# Altium footprint library Wurth_Elektronik_Electromechanic_Wire_to_Board_Connectors_rev16a.PCBLIB: 662 footprints (part 25 of 42)
Each footprint in its own frame and in the unit in brackets; x right, y up, seen from the top. Pads: shape width x height; smd on the part's side, far side on the other; paste and mask are expansions set on the pad; w line width, h text height; cw(c..) or ccw(c..) is an arc to the next point about the centre after c.
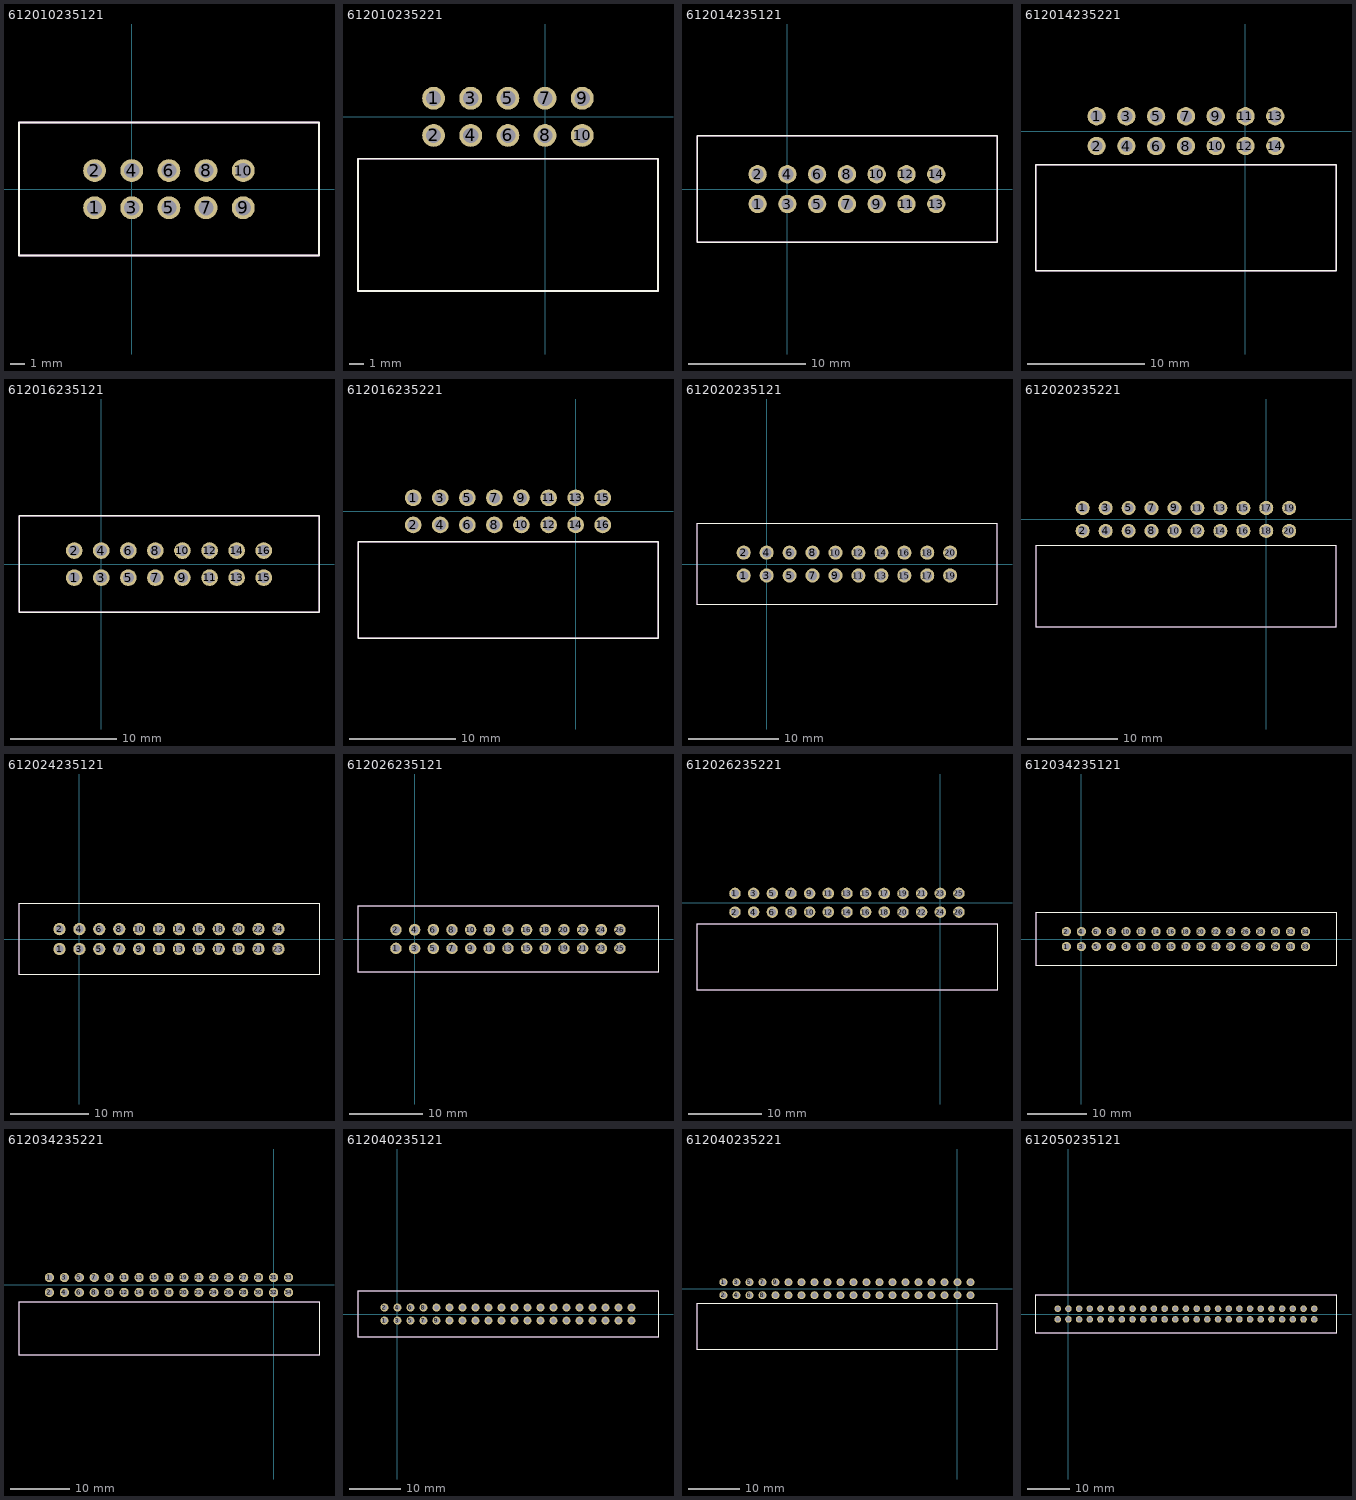
[diagram p24: the footprints below, top view; thin cyan lines are the x and y axes]

## 612010235121 [mil]
pads (10):
  round 61.5 hole 41: 1(-100,-50) 2(-100,50) 3(0,-50) 4(0,50) 5(100,-50) 6(100,50) 7(200,-50) 8(200,50) 9(300,-50) 10(300,50)
Top Overlay:
  lines w5: -303.54,-178.15 504,-178.15 504,179 -303.54,179 -303.54,-178.15
Mechanical 2:
  text ">NAME" at 25,200 h77.5
Mechanical 4:
  text ">VALUE" at 0,-250 h77.5
Mechanical 16:
  lines w5: -303.54,-178.15 504,-178.15 504,179 -303.54,179 -303.54,-178.15
  text "1" at -125,-75 h77.5
  text "10" at 275,25 h77.5

## 612010235221 [mil]
pads (10):
  round 61.5 hole 41: 1(-300,50) 2(-300,-50) 3(-200,50) 4(-200,-50) 5(-100,50) 6(-100,-50) 7(0,50) 8(0,-50) 9(100,50) 10(100,-50)
Top Overlay:
  lines w5: -503.54,-469.29 304,-469.29 304,-112.99 -503.54,-112.99 -503.54,-469.29
Mechanical 2:
  text ">NAME" at 360,-254.74 h77.5
Mechanical 4:
  text ">VALUE" at 360,-347.69 h77.5
Mechanical 16:
  lines w5: -503.54,-469.29 304,-469.29 304,-112.99 -503.54,-112.99 -503.54,-469.29
  text "1" at -325,25 h77.5
  text "10" at 50,-75 h77.5

## 612014235121 [mil]
pads (14):
  round 61.5 hole 41: 1(-100,-50) 2(-100,50) 3(0,-50) 4(0,50) 5(100,-50) 6(100,50) 7(200,-50) 8(200,50) 9(300,-50) 10(300,50) 11(400,-50) 12(400,50) 13(500,-50) 14(500,50)
Top Overlay:
  lines w5: -303.54,-178.15 704,-178.15 704,179 -303.54,179 -303.54,-178.15
Mechanical 2:
  text ">NAME" at 125,200 h77.5
Mechanical 4:
  text ">VALUE" at 100,-250 h77.5
Mechanical 16:
  lines w5: -303.54,-178.15 704,-178.15 704,179 -303.54,179 -303.54,-178.15
  text "1" at -125,-75 h77.5
  text "14" at 450,25 h77.5

## 612014235221 [mil]
pads (14):
  round 61.5 hole 41: 1(-500,50) 2(-500,-50) 3(-400,50) 4(-400,-50) 5(-300,50) 6(-300,-50) 7(-200,50) 8(-200,-50) 9(-100,50) 10(-100,-50) 11(0,50) 12(0,-50) 13(100,50) 14(100,-50)
Top Overlay:
  lines w5: -703.54,-469.29 304,-469.29 304,-112.99 -703.54,-112.99 -703.54,-469.29
Mechanical 2:
  text ">NAME" at 360,-254.74 h77.5
Mechanical 4:
  text ">VALUE" at 360,-347.69 h77.5
Mechanical 16:
  lines w5: -703.54,-469.29 304,-469.29 304,-112.99 -703.54,-112.99 -703.54,-469.29
  text "1" at -525,25 h77.5
  text "14" at 50,-75 h77.5

## 612016235121 [mil]
pads (16):
  round 61.5 hole 41: 1(-100,-50) 2(-100,50) 3(0,-50) 4(0,50) 5(100,-50) 6(100,50) 7(200,-50) 8(200,50) 9(300,-50) 10(300,50) 11(400,-50) 12(400,50) 13(500,-50) 14(500,50) 15(600,-50) 16(600,50)
Top Overlay:
  lines w5: -303.54,-178.15 804,-178.15 804,179 -303.54,179 -303.54,-178.15
Mechanical 2:
  text ">NAME" at 125,200 h77.5
Mechanical 4:
  text ">VALUE" at 100,-250 h77.5
Mechanical 16:
  lines w5: -303.54,-178.15 804,-178.15 804,179 -303.54,179 -303.54,-178.15
  text "1" at -125,-75 h77.5
  text "16" at 575,25 h77.5

## 612016235221 [mil]
pads (16):
  round 61.5 hole 41: 1(-600,50) 2(-600,-50) 3(-500,50) 4(-500,-50) 5(-400,50) 6(-400,-50) 7(-300,50) 8(-300,-50) 9(-200,50) 10(-200,-50) 11(-100,50) 12(-100,-50) 13(0,50) 14(0,-50) 15(100,50) 16(100,-50)
Top Overlay:
  lines w5: -803.54,-469.29 304,-469.29 304,-112.99 -803.54,-112.99 -803.54,-469.29
Mechanical 2:
  text ">NAME" at 360,-254.74 h77.5
Mechanical 4:
  text ">VALUE" at 360,-347.69 h77.5
Mechanical 16:
  lines w5: -803.54,-469.29 304,-469.29 304,-112.99 -803.54,-112.99 -803.54,-469.29
  text "1" at -625,25 h77.5
  text "16" at 50,-75 h77.5

## 612020235121 [mil]
pads (20):
  round 61.5 hole 41: 1(-100,-50) 2(-100,50) 3(0,-50) 4(0,50) 5(100,-50) 6(100,50) 7(200,-50) 8(200,50) 9(300,-50) 10(300,50) 11(400,-50) 12(400,50) 13(500,-50) 14(500,50) 15(600,-50) 16(600,50) 17(700,-50) 18(700,50) 19(800,-50) 20(800,50)
Top Overlay:
  lines w5: -303.54,-178.15 1004,-178.15 1004,179 -303.54,179 -303.54,-178.15
Mechanical 2:
  text ">NAME" at 200,200 h77.5
Mechanical 4:
  text ">VALUE" at 175,-250 h77.5
Mechanical 16:
  lines w5: -303.54,-178.15 1004,-178.15 1004,179 -303.54,179 -303.54,-178.15
  text "1" at -125,-75 h77.5
  text "20" at 775,25 h77.5

## 612020235221 [mil]
pads (20):
  round 61.5 hole 41: 1(-800,50) 2(-800,-50) 3(-700,50) 4(-700,-50) 5(-600,50) 6(-600,-50) 7(-500,50) 8(-500,-50) 9(-400,50) 10(-400,-50) 11(-300,50) 12(-300,-50) 13(-200,50) 14(-200,-50) 15(-100,50) 16(-100,-50) 17(0,50) 18(0,-50) 19(100,50) 20(100,-50)
Top Overlay:
  lines w5: -1003.54,-469.29 304,-469.29 304,-112.99 -1003.54,-112.99 -1003.54,-469.29
Mechanical 2:
  text ">NAME" at 359,-254.74 h77.5
Mechanical 4:
  text ">VALUE" at 359,-347.69 h77.5
Mechanical 16:
  lines w5: -1003.54,-469.29 304,-469.29 304,-112.99 -1003.54,-112.99 -1003.54,-469.29
  text "1" at -825,25 h77.5
  text "20" at 75,-75 h77.5

## 612024235121 [mil]
pads (24):
  round 61.5 hole 41: 1(-100,-50) 2(-100,50) 3(0,-50) 4(0,50) 5(100,-50) 6(100,50) 7(200,-50) 8(200,50) 9(300,-50) 10(300,50) 11(400,-50) 12(400,50) 13(500,-50) 14(500,50) 15(600,-50) 16(600,50) 17(700,-50) 18(700,50) 19(800,-50) 20(800,50) 21(900,-50) 22(900,50) 23(1000,-50) 24(1000,50)
Top Overlay:
  lines w5: -303.54,-178.15 1204,-178.15 1204,179 -303.54,179 -303.54,-178.15
Mechanical 2:
  text ">NAME" at 350,200 h77.5
Mechanical 4:
  text ">VALUE" at 325,-250 h77.5
Mechanical 16:
  lines w5: -303.54,-178.15 1204,-178.15 1204,179 -303.54,179 -303.54,-178.15
  text "1" at -125,-75 h77.5
  text "24" at 975,25 h77.5

## 612026235121 [mil]
pads (26):
  round 61.5 hole 41: 1(-100,-50) 2(-100,50) 3(0,-50) 4(0,50) 5(100,-50) 6(100,50) 7(200,-50) 8(200,50) 9(300,-50) 10(300,50) 11(400,-50) 12(400,50) 13(500,-50) 14(500,50) 15(600,-50) 16(600,50) 17(700,-50) 18(700,50) 19(800,-50) 20(800,50) 21(900,-50) 22(900,50) 23(1000,-50) 24(1000,50) 25(1100,-50) 26(1100,50)
Top Overlay:
  lines w5: -303.54,-178.15 1304,-178.15 1304,179 -303.54,179 -303.54,-178.15
Mechanical 2:
  text ">NAME" at 425,200 h77.5
Mechanical 4:
  text ">VALUE" at 425,-250 h77.5
Mechanical 16:
  lines w5: -303.54,-178.15 1304,-178.15 1304,179 -303.54,179 -303.54,-178.15
  text "1" at -125,-75 h77.5
  text "26" at 1075,25 h77.5

## 612026235221 [mil]
pads (26):
  round 61.5 hole 41: 1(-1100,50) 2(-1100,-50) 3(-1000,50) 4(-1000,-50) 5(-900,50) 6(-900,-50) 7(-800,50) 8(-800,-50) 9(-700,50) 10(-700,-50) 11(-600,50) 12(-600,-50) 13(-500,50) 14(-500,-50) 15(-400,50) 16(-400,-50) 17(-300,50) 18(-300,-50) 19(-200,50) 20(-200,-50) 21(-100,50) 22(-100,-50) 23(0,50) 24(0,-50) 25(100,50) 26(100,-50)
Top Overlay:
  lines w5: -1303.54,-469.29 304,-469.29 304,-112.99 -1303.54,-112.99 -1303.54,-469.29
Mechanical 2:
  text ">NAME" at 360,-254.74 h77.5
Mechanical 4:
  text ">VALUE" at 360,-347.69 h77.5
Mechanical 16:
  lines w5: -1303.54,-469.29 304,-469.29 304,-112.99 -1303.54,-112.99 -1303.54,-469.29
  text "1" at -1125,25 h77.5
  text "26" at 50,-75 h77.5

## 612034235121 [mil]
pads (34):
  round 61.5 hole 41: 1(-100,-50) 2(-100,50) 3(0,-50) 4(0,50) 5(100,-50) 6(100,50) 7(200,-50) 8(200,50) 9(300,-50) 10(300,50) 11(400,-50) 12(400,50) 13(500,-50) 14(500,50) 15(600,-50) 16(600,50) 17(700,-50) 18(700,50) 19(800,-50) 20(800,50) 21(900,-50) 22(900,50) 23(1000,-50) 24(1000,50) 25(1100,-50) 26(1100,50) 27(1200,-50) 28(1200,50) 29(1300,-50) 30(1300,50) 31(1400,-50) 32(1400,50) 33(1500,-50) 34(1500,50)
Top Overlay:
  lines w5: -303.54,-178.15 1704,-178.15 1704,179 -303.54,179 -303.54,-178.15
Mechanical 2:
  text ">NAME" at 600,200 h77.5
Mechanical 4:
  text ">VALUE" at 600,-250 h77.5
Mechanical 16:
  lines w5: -303.54,-178.15 1704,-178.15 1704,179 -303.54,179 -303.54,-178.15
  text "1" at -125,-75 h77.5
  text "34" at 1475,25 h77.5

## 612034235221 [mil]
pads (34):
  round 61.5 hole 41: 1(-1500,50) 2(-1500,-50) 3(-1400,50) 4(-1400,-50) 5(-1300,50) 6(-1300,-50) 7(-1200,50) 8(-1200,-50) 9(-1100,50) 10(-1100,-50) 11(-1000,50) 12(-1000,-50) 13(-900,50) 14(-900,-50) 15(-800,50) 16(-800,-50) 17(-700,50) 18(-700,-50) 19(-600,50) 20(-600,-50) 21(-500,50) 22(-500,-50) 23(-400,50) 24(-400,-50) 25(-300,50) 26(-300,-50) 27(-200,50) 28(-200,-50) 29(-100,50) 30(-100,-50) 31(0,50) 32(0,-50) 33(100,50) 34(100,-50)
Top Overlay:
  lines w5: -1703.54,-469.29 304,-469.29 304,-112.99 -1703.54,-112.99 -1703.54,-469.29
Mechanical 2:
  text ">NAME" at 360,-254.74 h77.5
Mechanical 4:
  text ">VALUE" at 360,-347.69 h77.5
Mechanical 16:
  lines w5: -1703.54,-469.29 304,-469.29 304,-112.99 -1703.54,-112.99 -1703.54,-469.29
  text "1" at -1525,25 h77.5
  text "34" at 75,-75 h77.5

## 612040235121 [mil]
pads (40):
  round 61.5 hole 41: 1(-100,-50) 2(-100,50) 3(0,-50) 4(0,50) 5(100,-50) 6(100,50) 7(200,-50) 8(200,50) 9(300,-50) 10(300,50) 11(400,-50) 12(400,50) 13(500,-50) 14(500,50) 15(600,-50) 16(600,50) 17(700,-50) 18(700,50) 19(800,-50) 20(800,50) 21(900,-50) 22(900,50) 23(1000,-50) 24(1000,50) 25(1100,-50) 26(1100,50) 27(1200,-50) 28(1200,50) 29(1300,-50) 30(1300,50) 31(1400,-50) 32(1400,50) 33(1500,-50) 34(1500,50) 35(1600,-50) 36(1600,50) 37(1700,-50) 38(1700,50) 39(1800,-50) 40(1800,50)
Top Overlay:
  lines w5: -303.54,-178.15 2004,-178.15 2004,179 -303.54,179 -303.54,-178.15
Mechanical 2:
  text ">NAME" at 825,200 h77.5
Mechanical 4:
  text ">VALUE" at 825,-250 h77.5
Mechanical 16:
  lines w5: -303.54,-178.15 2004,-178.15 2004,179 -303.54,179 -303.54,-178.15
  text "1" at -125,-75 h77.5
  text "40" at 1750,25 h77.5

## 612040235221 [mil]
pads (40):
  round 61.5 hole 41: 1(-1800,50) 2(-1800,-50) 3(-1700,50) 4(-1700,-50) 5(-1600,50) 6(-1600,-50) 7(-1500,50) 8(-1500,-50) 9(-1400,50) 10(-1400,-50) 11(-1300,50) 12(-1300,-50) 13(-1200,50) 14(-1200,-50) 15(-1100,50) 16(-1100,-50) 17(-1000,50) 18(-1000,-50) 19(-900,50) 20(-900,-50) 21(-800,50) 22(-800,-50) 23(-700,50) 24(-700,-50) 25(-600,50) 26(-600,-50) 27(-500,50) 28(-500,-50) 29(-400,50) 30(-400,-50) 31(-300,50) 32(-300,-50) 33(-200,50) 34(-200,-50) 35(-100,50) 36(-100,-50) 37(0,50) 38(0,-50) 39(100,50) 40(100,-50)
Top Overlay:
  lines w5: -2003.54,-469.29 304,-469.29 304,-112.99 -2003.54,-112.99 -2003.54,-469.29
Mechanical 2:
  text ">NAME" at 360,-254.74 h77.5
Mechanical 4:
  text ">VALUE" at 360,-347.69 h77.5
Mechanical 16:
  lines w5: -2003.54,-469.29 304,-469.29 304,-112.99 -2003.54,-112.99 -2003.54,-469.29
  text "1" at -1825,25 h77.5
  text "40" at 50,-75 h77.5

## 612050235121 [mil]
pads (50):
  round 61.5 hole 41: 1(-100,-50) 2(-100,50) 3(0,-50) 4(0,50) 5(100,-50) 6(100,50) 7(200,-50) 8(200,50) 9(300,-50) 10(300,50) 11(400,-50) 12(400,50) 13(500,-50) 14(500,50) 15(600,-50) 16(600,50) 17(700,-50) 18(700,50) 19(800,-50) 20(800,50) 21(900,-50) 22(900,50) 23(1000,-50) 24(1000,50) 25(1100,-50) 26(1100,50) 27(1200,-50) 28(1200,50) 29(1300,-50) 30(1300,50) 31(1400,-50) 32(1400,50) 33(1500,-50) 34(1500,50) 35(1600,-50) 36(1600,50) 37(1700,-50) 38(1700,50) 39(1800,-50) 40(1800,50) 41(1900,-50) 42(1900,50) 43(2000,-50) 44(2000,50) 45(2100,-50) 46(2100,50) 47(2200,-50) 48(2200,50) 49(2300,-50) 50(2300,50)
Top Overlay:
  lines w5: -303.54,-178.15 2504,-178.15 2504,179 -303.54,179 -303.54,-178.15
Mechanical 2:
  text ">NAME" at 1075,200 h77.5
Mechanical 4:
  text ">VALUE" at 1050,-275 h77.5
Mechanical 16:
  lines w5: -303.54,-178.15 2504,-178.15 2504,179 -303.54,179 -303.54,-178.15
  text "1" at -125,-75 h77.5
  text "50" at 2275,25 h77.5